# Altium footprint library 2-Pcblib_Cap.PcbLib: 73 footprints (part 1 of 5)
Each footprint in its own frame and in the unit in brackets; x right, y up, seen from the top. Pads: shape width x height; smd on the part's side, far side on the other; paste and mask are expansions set on the pad; w line width, h text height; cw(c..) or ccw(c..) is an arc to the next point about the centre after c.
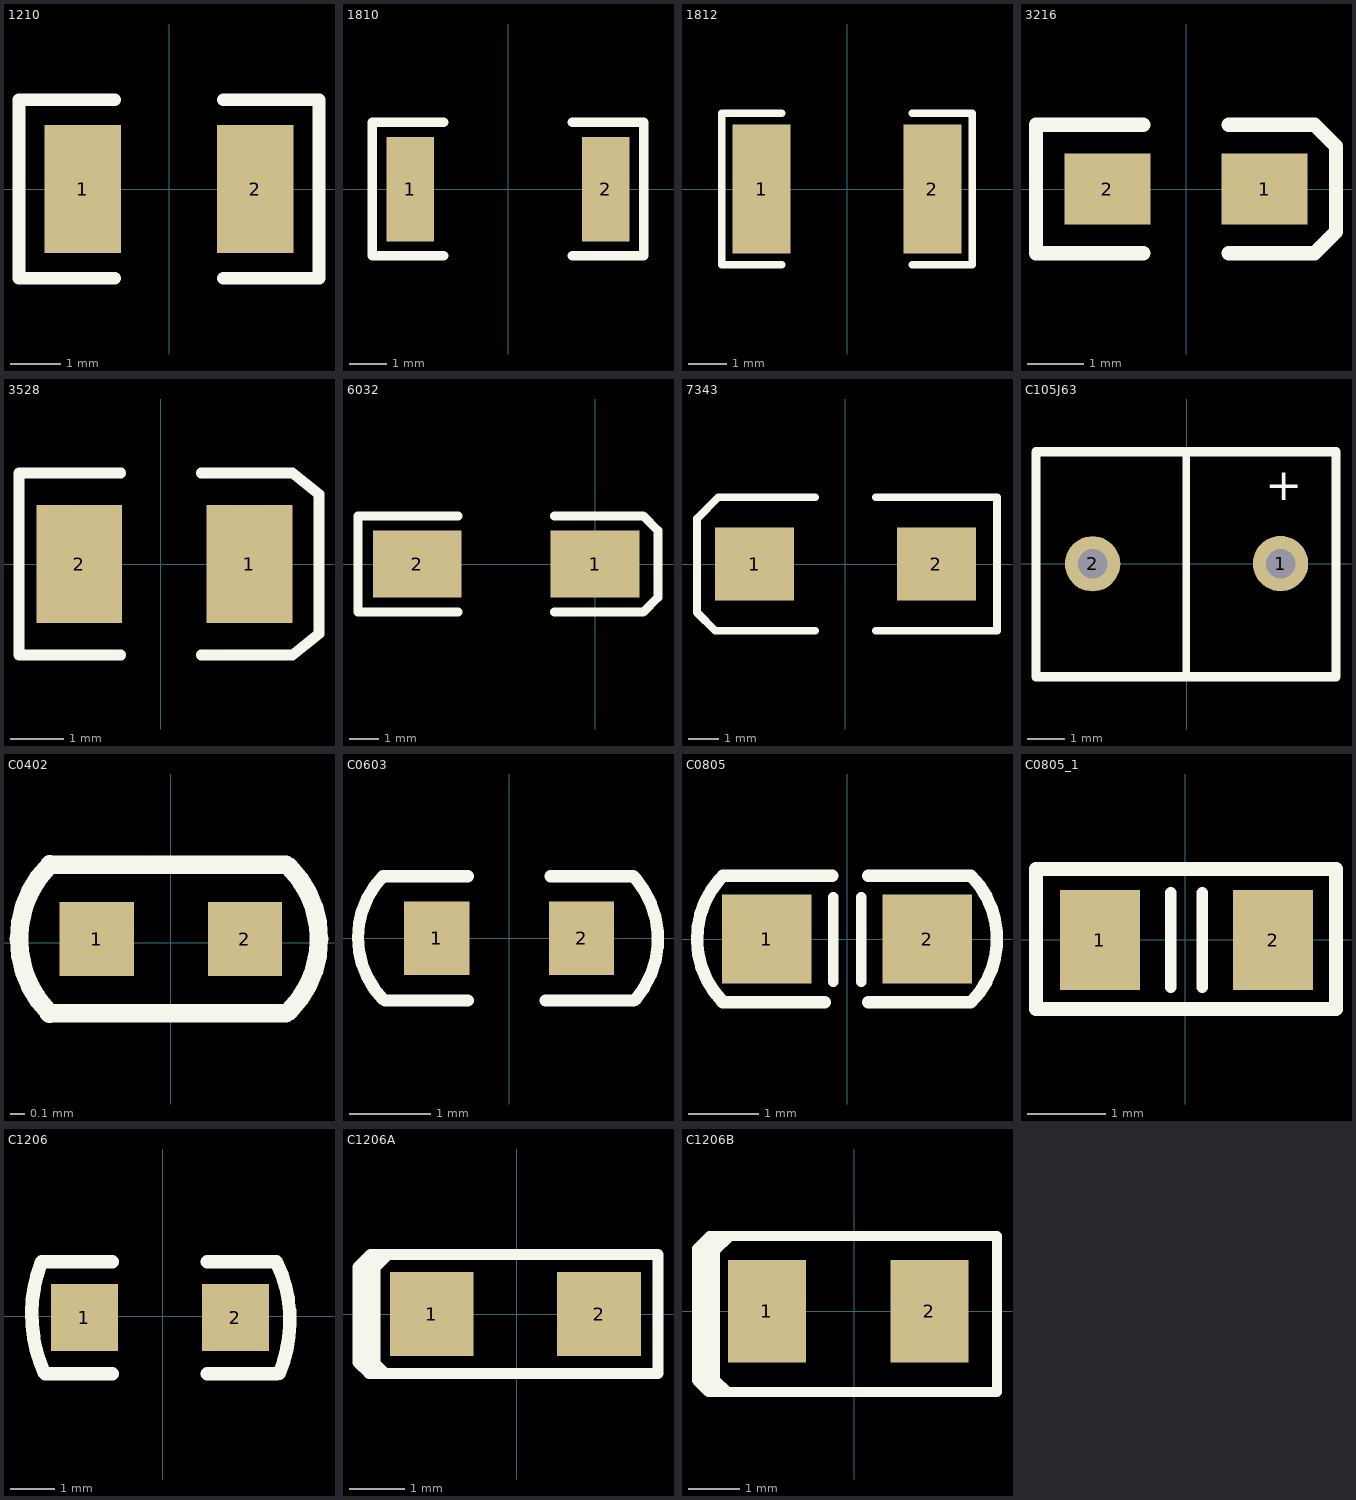
[diagram p0: the footprints below, top view; thin cyan lines are the x and y axes]

## 2KV [mm]
3D body: height 12.49, standoff -5, extent -5.288,-2.475 5.676,2.525
3D body: height 10.03, standoff -3.16, extent -3.645,-5.487 4.356,-3.099

## 1210 [mil]
pads (2):
  rect 60x100 smd: 1(-67.5,0) 2(67.5,0)
Top Overlay:
  lines w10: -42.5,-70 -117.5,-70 -117.5,70 -42.5,70 ; 42.5,-70 117.5,-70 117.5,70 42.5,70
3D body: height 51.28, standoff -0.1, extent -64.98,-47.3 61,51.32

## 1810 [mil]
pads (2):
  rect 50x110 smd: 1(-102.5,0) 2(102.5,0)
Top Overlay:
  lines w10: -67.6,-69.83 -142.6,-69.83 -142.6,70.17 -67.6,70.17 ; 67.4,-69.83 142.4,-69.83 142.4,70.17 67.4,70.17
3D body: height 103.74, standoff -1.38, extent -108.36,-52 96.36,53.12

## 1812 [mm]
pads (2):
  rect 1.52x3.4 smd: 1(-2.25,0) 2(2.25,0)
Top Overlay:
  lines w0.2: -3.3,2 -3.3,-2 -1.714,-2 ; -3.277,2 -1.714,2 ; 1.714,-2 3.3,-2 3.3,2 1.714,2
3D body: height 1.6, standoff 0, extent -2.212,-1.6 2.288,1.6

## 3216 [mil]
pads (2):
  rect 60x50 smd: 1(55,0) 2(-55,0)
Top Overlay:
  lines w10: -30,-45 -105,-45 -105,45 -30,45 ; 30,-45 90,-45 105,-30 105,30 90,45 30,45
3D body: height 62.99, standoff 0, extent -64.98,-30.99 61,32

## 3528 [mm]
height 0.6
pads (2):
  rect 1.6x2.2 smd: 1(1.651,0) 2(-1.524,0)
Top Overlay:
  lines w0.2: -0.75,-1.7 -2.65,-1.7 -2.65,1.7 -0.75,1.7 ; 0.75,-1.7 2.45,-1.7 2.95,-1.3 2.95,1.3 2.45,1.7 0.75,1.7
3D body: height 2.03, standoff 0, extent -1.748,-1.439 1.952,1.491

## 6032 [mil]
pads (2):
  rect 120x90 smd: 1(0,0) 2(-240,0)
Top Overlay:
  lines w12: -185,-65 -320,-65 -320,65 -185,65 ; -55,-65 65,-65 85,-45 85,45 65,65 -55,65
3D body: height 102.36, standoff 0, extent -246.23,-63.99 -10,62

## 7343 [mm]
pads (2):
  rect 2.6x2.4 smd: 1(-3,0) 2(3,0)
Top Overlay:
  lines w0.254: -1,-2.2 -4.3,-2.2 -4.9,-1.6 -4.9,1.5 -4.2,2.2 -1,2.2 ; 1,-2.2 5,-2.2 ; 1,2.2 5,2.2 5,-2.2 ; 5,-2.2 5,-2.2
3D body: height 3.1, standoff 0, extent -3.774,-2.351 3.826,2.249

## C105J63 [mm]
pads (2):
  round 1.5 hole 0.8: 1(2.546,0.003) 2(-2.546,-0.003)
Top Overlay:
  lines w0.203: -0.003,-3.054 -0.003,3.042
  lines w0.254: -4.079,-3.06 4.049,-3.06 4.049,3.036 3.033,3.036 -4.079,3.036 -4.079,-0.012 -4.079,-3.06
  text "+" at 2.134,1.422 h1.5
3D body: height 7, standoff -2.5, extent -3.581,-2.75 3.619,2.75

## C0402 [mil]
pads (2):
  rect 20x20 smd: 1(-20,1) 2(20,1)
Top Overlay:
  lines w5: -33,-19 31,-19 ; -32.65,-19.15 cw(c-12.5,1) -32.65,21.15 ; -32,21 31,21 ; 31.95,-18.45 ccw(c12.5,1) 31.95,20.45
3D body: height 13.78, standoff 0, extent -19.68,-8.69 19.68,11

## C0603 [mm]
pads (2):
  rect 0.8x0.9 smd: 1(-0.889,0) 2(0.889,0)
Top Overlay:
  lines w0.15: -1.554,-0.743 cw(c-0.77,0.007) -1.549,0.762 ; -1.524,-0.762 -0.508,-0.762 ; -1.524,0.762 -0.508,0.762 ; 0.445,-0.762 1.524,-0.762 ; 0.508,0.762 1.524,0.762 ; 1.545,-0.758 ccw(c0.691,-0.008) 1.549,0.737
3D body: height 0.45, standoff 0, extent -0.749,-0.394 0.851,0.406

## C0805 [mil]
pads (2):
  rect 50x50 smd: 1(-45,0) 2(45,0)
Top Overlay:
  lines w5.91: -7.75,-23.83 -7.75,23.41 ; 8,-23.83 8,23.41
  lines w7: -71.39,33.35 ccw(c-33.74,0) -70.09,-34.77 ; -69.64,-35.43 -12.52,-35.43 ; -69.64,35.43 -8.39,35.43 ; 11.82,-35.43 69.17,-35.43 ; 11.82,35.43 69.17,35.43 ; 69.31,-35.57 ccw(c33.74,0) 69.31,35.57
3D body: height 19.68, standoff 0, extent -39,-25 39.74,24.21

## C0805_1 [mil]
height 47.24
pads (2):
  rect 40x50 smd: 1(-42.57,-0.21) 2(43.94,-0.21)
Top Overlay:
  lines w5.91: -7.19,-23.83 -7.19,23.41 ; 8.56,-23.83 8.56,23.41
  lines w7: -74.56,-34.71 75.44,-34.71 75.44,35.29 -74.56,35.29 -74.56,0.29 -74.56,-34.71
3D body: height 19.68, standoff 0, extent -38.4,-25.4 40.34,23.81

## C1206 [mil]
pads (2):
  rect 60x60 smd: 1(-70,-1) 2(65,-1)
Top Overlay:
  lines w12: -108,49 -45,49 ; -105,-51 -45,-51 ; 40,-51 102,-51 ; 40,49 101,49
  lines w12.01: -109,47 ccw(c11.31,2.22) -105.76,-50.46 ; 101.64,49.04 cw(c-7.37,-3.58) 104.06,-50.87
3D body: height 21.65, standoff 0, extent -64,-33 61.98,29.99

## C1206A [mm]
pads (2):
  rect 1.5x1.5 smd: 1(-1.524,0) 2(1.476,0)
Top Overlay:
  lines w0.203: -2.667,-0.889 -2.667,0.889 ; -2.54,-0.635 -2.54,-0.888 -2.361,-1.067 -2.64,-1.067 -2.843,-0.864 -2.843,0.838 -2.615,1.067 -2.54,1.067 ; -2.54,0.533 -2.54,0.837 -2.31,1.067 ; -2.54,1.067 -0.61,1.067 0.627,1.067 2.532,1.067 2.532,1.041 2.532,-1.067 0.652,-1.067 -0.61,-1.067 -2.515,-1.067 -2.54,-1.041 -2.54,1.067
3D body: height 0.95, standoff 0, extent -1.626,-0.813 1.574,0.787

## C1206B [mil]
pads (2):
  rect 60x78.74 smd: 1(-67,0) 2(58,0)
Top Overlay:
  lines w1: -106.37,-39.37 -106.37,39.37
  lines w8: -120.82,-47.64 -120.82,44.25 -114.74,47.24 -114.74,-55.12 -112,-60 -112,55 -109,58 ; -120.82,-38 -120.82,-53.18 -112,-62 ; -107,-29 -107,-52.5 -97.5,-62 ; -107,24 -107,46.5 -95.5,58 ; 17,58 107,58 110,58 110,-62 108,-62 18,-62 ; 40.5,58 -34,58 -109,58 ; 42.5,-62 -36,-62 -111,-62 -112,-62 ; -112,-62 -110,-62 ; -112,-62 -110,-62 ; -111,58 -109,58 ; -111,58 -109,58 ; -111,58 -120.82,48.18 -120.82,-51.18 -110,-62 ; -111,58 -107,58 -107,-59 -110,-62
3D body: height 37.4, standoff 0, extent -66,-32 59.98,30.99